# Altium footprint library LUMI_Standard_Auto_Soldering_LIB.PcbLib: 344 footprints (part 21 of 22)
Each footprint in its own frame and in the unit in brackets; x right, y up, seen from the top. Pads: shape width x height; smd on the part's side, far side on the other; paste and mask are expansions set on the pad; w line width, h text height; cw(c..) or ccw(c..) is an arc to the next point about the centre after c.
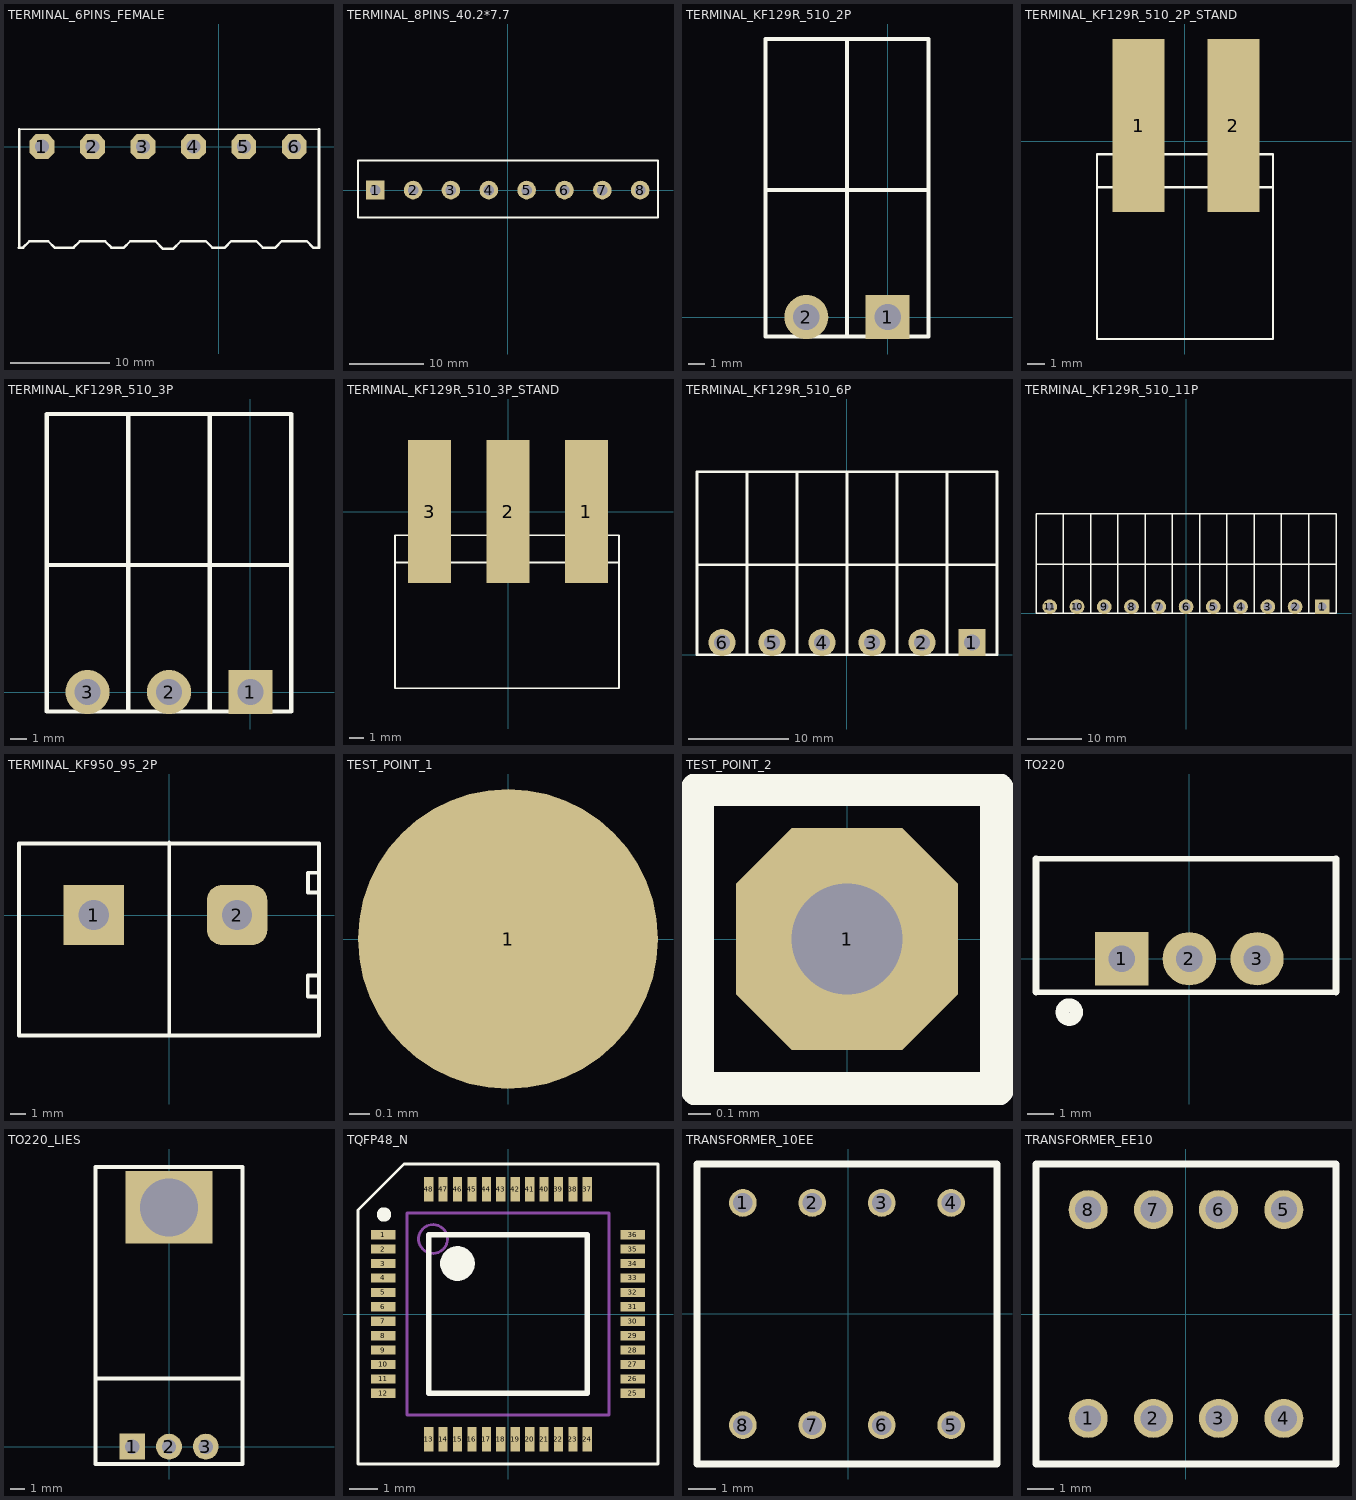
[diagram p20: the footprints below, top view; thin cyan lines are the x and y axes]

## TERMINAL_6PINS_FEMALE [mm] "hkgvh"
pads (6):
  oct 2.5x2.5 hole 1.4: 1(-17.78,0) 2(-12.7,0) 3(-7.62,0) 4(-2.54,0) 5(2.54,0) 6(7.62,0)
Top Overlay:
  lines w0.15: -20.066,1.753 10.109,1.753
  lines w0.254: -20.066,1.753 -20.066,-10.135 -20.091,-10.16 -19.685,-10.16 -19.05,-9.525 -17.145,-9.525 -16.51,-10.16 -14.605,-10.16 -13.97,-9.525 -11.43,-9.525 -10.795,-10.16 -9.525,-10.16 -8.89,-9.525 -6.35,-9.525 -5.588,-10.287 -4.572,-10.287 -3.81,-9.525 -1.27,-9.525 -0.635,-10.16 0.635,-10.16 1.27,-9.525 3.81,-9.525 4.445,-10.16 5.715,-10.16 6.35,-9.525 8.89,-9.525 9.525,-10.16 10.109,-10.16 10.109,1.753
3D body: height 8.47, standoff -4, extent -0.025,-10.191 9.975,1.809
3D body: height 8.47, standoff -4, extent -10.094,-10.222 -0.094,1.778
3D body: height 8.47, standoff -4, extent -20.153,-10.222 -10.153,1.778

## TERMINAL_8PINS_40.2*7.7 [mm] "hkgvh"
pads (8):
  rect 2.5x2.5 hole 1.4: 1(-17.78,0)
  round 2.5 hole 1.4: 2(-12.7,0) 3(-7.62,0) 4(-2.54,0) 5(2.54,0) 6(7.62,0) 7(12.7,0) 8(17.78,0)
Top Overlay:
  lines w0.254: -20.091,-3.683 20.168,-3.683 20.168,3.962 -20.091,3.962 -20.091,-3.683
3D body: height 10, standoff -4, extent -19.884,-3.563 -9.884,3.937
3D body: height 10, standoff -4, extent -9.978,-3.512 0.022,3.988
3D body: height 10, standoff -4, extent -0.047,-3.588 9.953,3.912
3D body: height 10, standoff -4, extent 9.884,-3.588 19.884,3.912

## TERMINAL_KF129R_510_2P [mm]
pads (2):
  rect 2.7x2.7 hole 1.6: 1(0,0)
  round 2.7 hole 1.6: 2(-5,0)
Top Overlay:
  lines w0.254: -7.5,7.8 2.5,7.8 ; -2.5,-1.2 -2.5,17.05 ; -7.5,-1.2 -7.5,17.06 2.5,17.06 2.5,-1.2 -7.5,-1.2
3D body: height 10.68, standoff -5.42, extent -7.5,-1.2 2.5,17

## TERMINAL_KF129R_510_2P_STAND [mm]
pads (2):
  rect 3x10 smd: 1(-2.667,0.889) 2(2.794,0.889)
Top Overlay:
  lines w0.127: -5.08,-2.667 5.08,-2.667 ; -5.08,-11.43 -5.08,-0.762 5.08,-0.762 5.08,-11.43 -5.08,-11.43
3D body: height -0.4, standoff -20.4, extent -5.617,-11.303 5.616,3.201

## TERMINAL_KF129R_510_3P [mm]
pads (3):
  rect 2.7x2.7 hole 1.6: 1(0,0)
  round 2.7 hole 1.6: 2(-5,0) 3(-10,0)
Top Overlay:
  lines w0.254: -12.5,7.8 -2.5,7.8 2.5,7.8 ; -7.5,-1.2 -7.5,17.05 ; -2.5,-1.2 -12.5,-1.2 -12.5,17.06 -2.5,17.06 ; -2.5,-1.2 -2.5,17.06 ; -2.5,-1.2 2.5,-1.2 2.5,17.06 -2.5,17.06
3D body: height 10.84, standoff -5.26, extent -12.512,-1.207 2.488,16.993

## TERMINAL_KF129R_510_3P_STAND [mm]
pads (3):
  rect 3x10 smd: 1(5.461,0) 2(0,0) 3(-5.461,0)
Top Overlay:
  lines w0.127: -7.874,-3.556 7.747,-3.556 ; -7.874,-12.319 -7.874,-1.651 7.747,-1.651 7.747,-12.319 -7.874,-12.319
3D body: height -0.3, standoff -20.3, extent -8.41,-12.244 2.823,2.259
3D body: height -0.3, standoff -20.3, extent -3.077,-12.244 8.156,2.259

## TERMINAL_KF129R_510_6P [mm]
pads (6):
  rect 2.7x2.7 hole 1.6: 1(12.524,1.225)
  round 2.7 hole 1.6: 2(7.524,1.225) 3(2.524,1.225) 4(-2.476,1.225) 5(-7.476,1.225) 6(-12.476,1.225)
Top Overlay:
  lines w0.254: -14.976,9.025 -4.976,9.025 0.024,9.025 10.024,9.025 15.024,9.025 ; -9.976,0.025 -9.976,18.275 ; 5.024,0.025 5.024,18.275 ; -4.976,0.025 -14.976,0.025 -14.976,18.285 -4.976,18.285 ; -4.976,0.025 -4.976,18.285 ; -4.976,0.025 0.024,0.025 ; -4.976,18.285 0.024,18.285 ; 0.024,0.025 0.024,18.285 ; 0.024,0.025 10.024,0.025 ; 0.024,0.025 0.024,18.285 ; 0.024,18.285 10.024,18.285 ; 10.024,0.025 10.024,18.285 ; 10.024,0.025 15.024,0.025 15.024,18.285 10.024,18.285
3D body: height 10.78, standoff -5.32, extent -15,0 15,18.2

## TERMINAL_KF129R_510_11P [mm]
pads (11):
  rect 2.7x2.7 hole 1.6: 1(24.966,1.196)
  round 2.7 hole 1.6: 2(19.966,1.196) 3(14.966,1.196) 4(9.966,1.196) 5(4.966,1.196) 6(-0.034,1.196) 7(-5.035,1.196) 8(-10.035,1.196) 9(-15.035,1.196) 10(-20.035,1.196) 11(-25.035,1.196)
Top Overlay:
  lines w0.254: -27.559,18.256 -22.535,18.256 ; -27.535,8.996 -22.535,8.996 -17.535,8.996 -7.535,8.996 -2.535,8.996 7.466,8.996 12.466,8.996 22.466,8.996 27.466,8.996 ; -27.535,18.246 -27.535,-0.004 -22.535,-0.004 ; -12.535,-0.004 -12.535,18.246 ; 2.466,-0.004 2.466,18.246 ; 17.466,-0.004 17.466,18.246 ; -22.535,-0.004 -17.535,-0.004 ; -22.535,-0.004 -22.535,18.256 ; -22.535,18.256 -17.535,18.256 ; -17.535,-0.004 -17.535,18.256 ; -17.535,-0.004 -7.535,-0.004 ; -17.535,-0.004 -17.535,18.256 ; -17.535,18.256 -7.535,18.256 ; -7.535,-0.004 -2.535,-0.004 ; -7.535,-0.004 -7.535,18.256 ; -7.535,18.256 -2.535,18.256 ; -2.535,-0.004 -2.535,18.256 ; -2.534,-0.004 7.466,-0.004 ; -2.534,-0.004 -2.534,18.256 ; -2.534,18.256 7.466,18.256 ; 7.466,-0.004 7.466,18.256 ; 7.466,-0.004 12.466,-0.004 ; 7.466,18.256 12.466,18.256 ; 12.466,-0.004 12.466,18.256 ; 12.466,-0.004 22.466,-0.004 ; 12.466,-0.004 12.466,18.256 ; 12.466,18.256 22.466,18.256 ; 22.466,-0.004 22.466,18.256 ; 22.466,-0.004 27.466,-0.004 27.466,18.256 22.466,18.256
3D body: height 10.56, standoff -5.54, extent -27.5,0 27.5,18.2

## TERMINAL_KF950_95_2P [mm]
pads (2):
  rect 4x4 hole 2: 1(-5,0)
  rrect50% 4x4 hole 2: 2(4.5,0)
Top Overlay:
  lines w0.254: 0,-7.975 0,4.8 ; 9.9,-5.4 9.175,-5.4 9.175,-4 9.9,-4 ; 9.925,1.5 9.2,1.5 9.2,2.8 9.925,2.8 ; -9.95,-7.975 9.925,-7.975 9.925,4.75 -9.95,4.75 -9.95,-7.975
3D body: height 21.59, standoff -5.51, extent -9.775,-7.829 9.783,4.617

## TEST_POINT_1 [mm]
pads (1):
  round 1.5 smd mask+0: 1(0,0)

## TEST_POINT_2 [mm]
pads (1):
  oct 1x1 hole 0.5: 1(0,0)
Top Overlay:
  lines w0.154: -0.675,-0.675 0.675,-0.675 0.675,0.675 -0.675,0.675 -0.675,-0.675

## TO220 [mm]
pads (3):
  rect 2x2 hole 1: 1(-2.54,0)
  round 2 hole 1: 2(0,0) 3(2.54,0)
Top Overlay:
  circle w0.5: c-4.5,-2 r0.266
  lines w0.203: -5.75,-1.25 5.5,-1.25 ; -5.75,3.75 5.5,3.75
  lines w0.254: -5.75,-1.25 -5.75,3.75 ; 5.5,-1.25 5.5,3.75
3D body: height 19.33, standoff -10, extent -5.631,-0.925 5.582,3.765

## TO220_LIES [mm]
pads (4):
  rect 1.778x1.778 hole 1: 1(-2.54,0)
  round 1.778 hole 1: 2(0,0) 3(2.54,0)
  rect 6x5 hole 4: ""(0,16.51)
Top Overlay:
  circle w0.254: c0,16.51 r2
  lines w0.254: -5.08,4.699 5.08,4.699 ; -5.08,-1.2 -5.08,19.304 5.08,19.304 5.08,-1.2 1.2,-1.2 -2.61,-1.2 -5.08,-1.2
3D body: height 4.45, standoff -1.79, extent -5.08,-0.226 5.08,19.054

## TQFP48_N [mm] "48-Pin Thin Quad Flat Pack 0.5 mm Pitch, IPC Medium Density"
height 1.6
pads (48):
  rect 0.85x0.32 smd mask+0.05: 1(-4.325,2.75) 2(-4.325,2.25) 3(-4.325,1.75) 4(-4.325,1.25) 5(-4.325,0.75) 6(-4.325,0.25) 7(-4.325,-0.25) 8(-4.325,-0.75) 9(-4.325,-1.25) 10(-4.325,-1.75) 11(-4.325,-2.25) 12(-4.325,-2.75) 25(4.325,-2.75) 26(4.325,-2.25) 27(4.325,-1.75) 28(4.325,-1.25) 29(4.325,-0.75) 30(4.325,-0.25) 31(4.325,0.25) 32(4.325,0.75) 33(4.325,1.25) 34(4.325,1.75) 35(4.325,2.25) 36(4.325,2.75)
  rect 0.32x0.85 smd mask+0.05: 13(-2.75,-4.35) 14(-2.25,-4.35) 15(-1.75,-4.35) 16(-1.25,-4.35) 17(-0.75,-4.35) 18(-0.25,-4.35) 19(0.25,-4.35) 20(0.75,-4.35) 21(1.25,-4.35) 22(1.75,-4.35) 23(2.25,-4.35) 24(2.75,-4.35) 37(2.75,4.325) 38(2.25,4.325) 39(1.75,4.325) 40(1.25,4.325) 41(0.75,4.325) 42(0.25,4.325) 43(-0.25,4.325) 44(-0.75,4.325) 45(-1.25,4.325) 46(-1.75,4.325) 47(-2.25,4.325) 48(-2.75,4.325)
Top Overlay:
  circle w0.25: c-4.3,3.45 r0.125
  circle w0.6: c-1.75,1.75 r0.3
  lines w0.1: -5.2,-5.2 5.2,-5.2 5.2,5.2 -3.6,5.2 -5.2,3.6 -5.2,-5.2
  lines w0.2: -2.75,-2.75 -2.75,2.75 2.75,2.75 2.75,-2.75 -2.75,-2.75
Mechanical 13:
  circle w0.1: c-2.6,2.6 r0.5
  lines w0.1: -3.5,-3.5 -3.5,3.5 3.5,3.5 3.5,-3.5 -3.5,-3.5
3D body: height 1.6, standoff 0, extent -3.5,-3.5 3.5,3.5
3D body: height 1.5, standoff 0, extent -4.5,-4.5 4.5,4.5

## TRANSFORMER_10EE [mm]
pads (8):
  round 1 hole 0.7 mask+0.07: 1(-3.8,4) 2(-1.3,4) 3(1.2,4) 4(3.7,4) 5(3.7,-4) 6(1.2,-4) 7(-1.3,-4) 8(-3.8,-4)
Top Overlay:
  lines w0.254: -5.45,-5.4 -5.45,5.4 5.35,5.4 5.35,-5.4 -5.45,-5.4
3D body: height 12.5, standoff 0, extent -5.5,-5.4 5.4,5.4

## TRANSFORMER_EE10 [mm]
pads (8):
  round 1.5 hole 1 mask+0.07: 1(-3.75,-4) 2(-1.25,-4) 3(1.25,-4) 4(3.75,-4) 5(3.75,4) 6(1.25,4) 7(-1.25,4) 8(-3.75,4)
Top Overlay:
  lines w0.254: -5.75,-5.75 -5.75,5.75 5.75,5.75 5.75,-5.75 -5.75,-5.75
3D body: height 12.5, standoff 0, extent -5.75,-5.75 5.75,5.75